# Altium footprint library mobinbyn-Header.PcbLib: 297 footprints (part 17 of 23)
Each footprint in its own frame and in the unit in brackets; x right, y up, seen from the top. Pads: shape width x height; smd on the part's side, far side on the other; paste and mask are expansions set on the pad; w line width, h text height; cw(c..) or ccw(c..) is an arc to the next point about the centre after c.
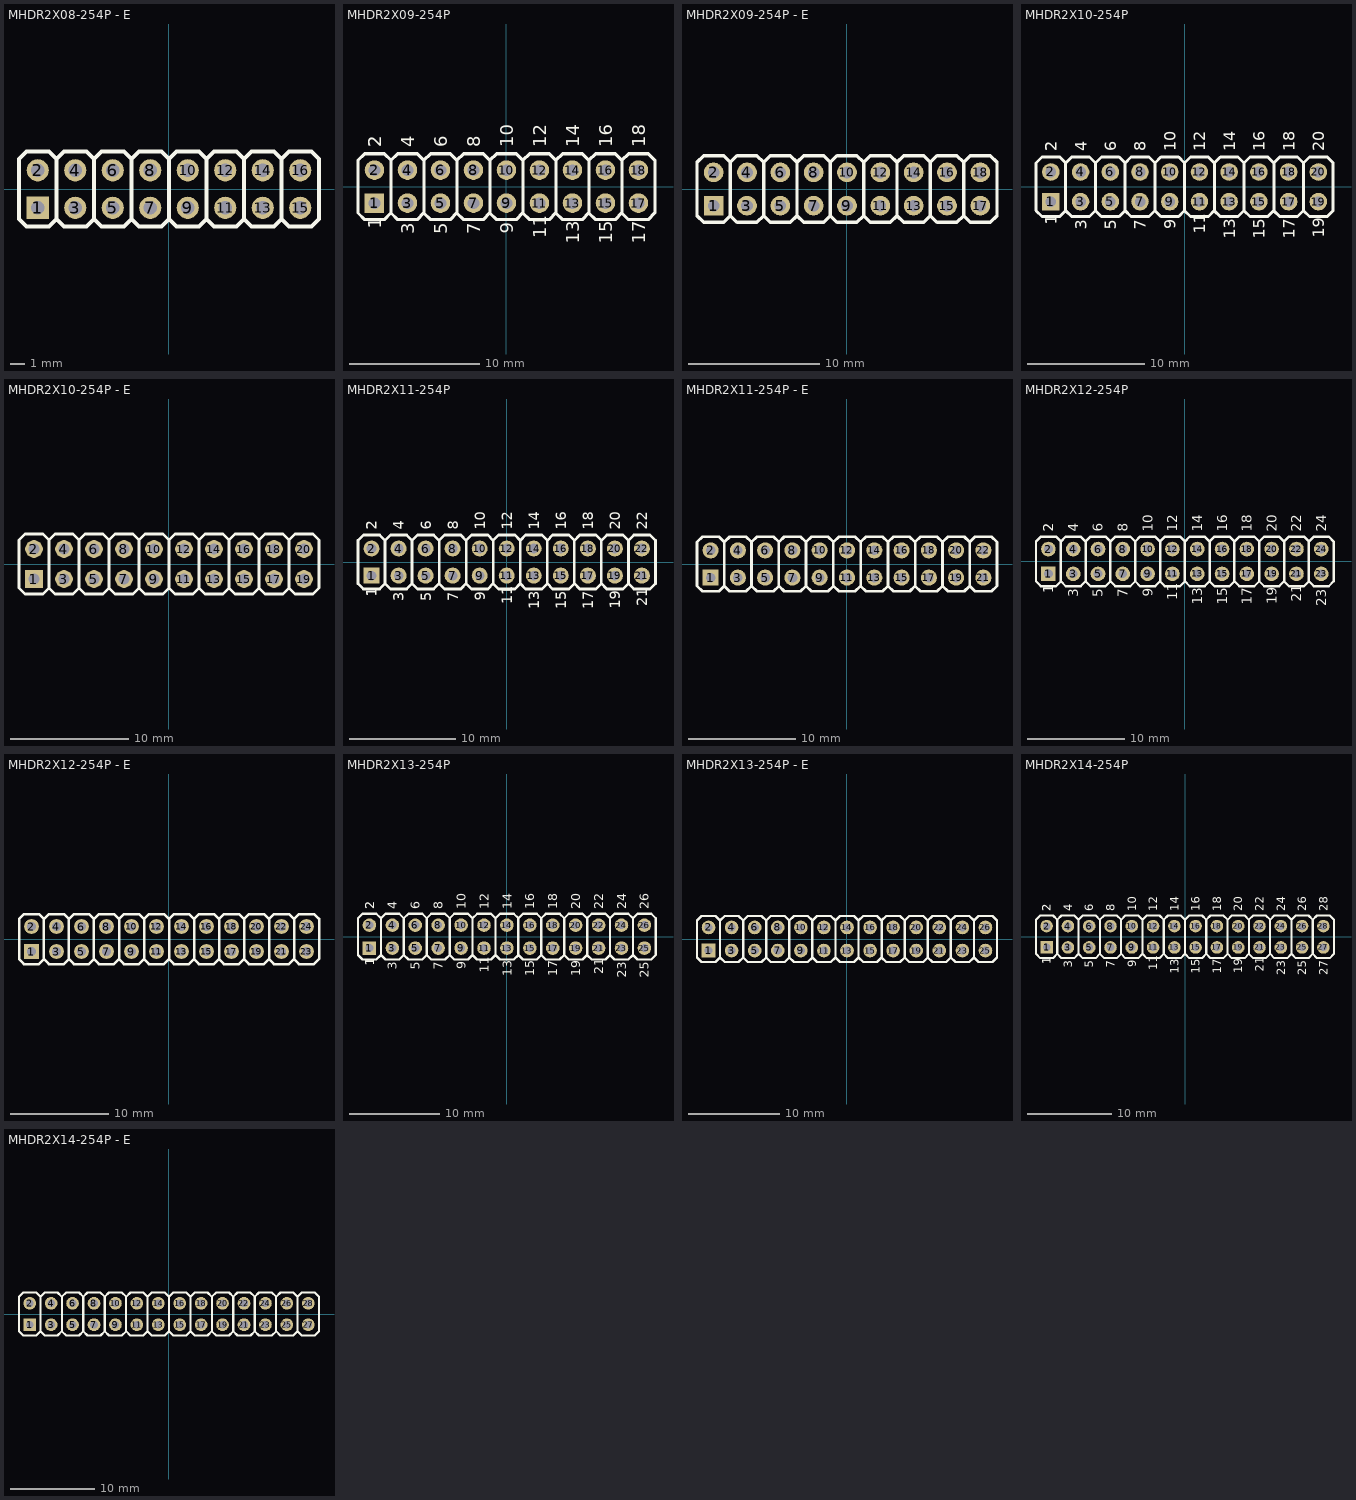
[diagram p16: the footprints below, top view; thin cyan lines are the x and y axes]

## MHDR2X08-254P - E [mm] "Male Header 2X08 with 2.54 mm Pitch"
pads (16):
  rect 1.5x1.5 hole 0.9: 1(-8.89,-1.27)
  round 1.5 hole 0.9: 2(-8.89,1.27) 3(-6.35,-1.27) 4(-6.35,1.27) 5(-3.81,-1.27) 6(-3.81,1.27) 7(-1.27,-1.27) 8(-1.27,1.27) 9(1.27,-1.27) 10(1.27,1.27) 11(3.81,-1.27) 12(3.81,1.27) 13(6.35,-1.27) 14(6.35,1.27) 15(8.89,-1.27) 16(8.89,1.27)
Top Overlay:
  lines w0.254: -7.62,-2.032 -7.113,-2.538 -5.588,-2.538 -5.08,-2.03 -5.08,2.034 -4.572,2.542 -3.049,2.542 -2.54,2.032 ; -7.62,2.032 -8.129,2.542 -9.652,2.542 -10.16,2.034 -10.16,-2.032 -9.653,-2.538 -8.128,-2.538 -7.62,-2.03 -7.62,2.034 -7.112,2.542 -5.589,2.542 -5.08,2.032 ; -5.08,-2.032 -4.573,-2.538 -3.048,-2.538 -2.54,-2.03 -2.54,2.034 -2.032,2.542 -0.509,2.542 0,2.032 ; -2.54,-2.032 -2.033,-2.538 -0.508,-2.538 0,-2.03 0,2.034 0.508,2.542 2.031,2.542 2.54,2.032 ; 0,-2.032 0.507,-2.538 2.032,-2.538 2.54,-2.03 2.54,2.034 3.048,2.542 4.571,2.542 5.08,2.032 ; 2.54,-2.032 3.047,-2.538 4.572,-2.538 5.08,-2.03 5.08,2.034 5.588,2.542 7.111,2.542 7.62,2.032 ; 5.08,-2.032 5.587,-2.538 7.112,-2.538 7.62,-2.03 7.62,2.034 8.128,2.542 9.651,2.542 10.16,2.032 ; 7.62,-2.032 8.127,-2.538 9.652,-2.538 10.16,-2.03 10.16,2.034
3D body "PIN.STEP": height 8.43, standoff -2.49, extent 7.62,-2.54 10.16,0
3D body "PIN.STEP": height 8.43, standoff -2.49, extent 7.62,0 10.16,2.54
3D body "PIN.STEP": height 8.43, standoff -2.49, extent -10.16,0 -7.62,2.54
3D body "PIN_mid.STEP": height 8.43, standoff -2.49, extent 5.08,-2.54 7.62,0
3D body "PIN_mid.STEP": height 8.43, standoff -2.49, extent 2.54,-2.54 5.08,0
3D body "PIN_mid.STEP": height 8.43, standoff -2.49, extent 0,-2.54 2.54,0
3D body "PIN_mid.STEP": height 8.43, standoff -2.49, extent -2.54,-2.54 0,0
3D body "PIN_mid.STEP": height 8.43, standoff -2.49, extent -5.08,-2.54 -2.54,0
3D body "PIN_mid.STEP": height 8.43, standoff -2.49, extent -7.62,-2.54 -5.08,0
3D body "PIN_mid.STEP": height 8.43, standoff -2.49, extent -7.62,0 -5.08,2.54
3D body "PIN_mid.STEP": height 8.43, standoff -2.49, extent 5.08,0 7.62,2.54
3D body "PIN_mid.STEP": height 8.43, standoff -2.49, extent 2.54,0 5.08,2.54
3D body "PIN_mid.STEP": height 8.43, standoff -2.49, extent 0,0 2.54,2.54
3D body "PIN_mid.STEP": height 8.43, standoff -2.49, extent -2.54,0 0,2.54
3D body "PIN_mid.STEP": height 8.43, standoff -2.49, extent -5.08,0 -2.54,2.54
3D body "PIN.STEP": height 8.43, standoff -2.49, extent -10.16,-2.54 -7.62,0

## MHDR2X09-254P [mm] "Male Header 2X09 with 2.54 mm Pitch"
pads (18):
  rect 1.5x1.5 hole 0.9: 1(-10.16,-1.27)
  round 1.5 hole 0.9: 2(-10.16,1.27) 3(-7.62,-1.27) 4(-7.62,1.27) 5(-5.08,-1.27) 6(-5.08,1.27) 7(-2.54,-1.27) 8(-2.54,1.27) 9(0,-1.27) 10(0,1.27) 11(2.54,-1.27) 12(2.54,1.27) 13(5.08,-1.27) 14(5.08,1.27) 15(7.62,-1.27) 16(7.62,1.27) 17(10.16,-1.27) 18(10.16,1.27)
Top Overlay:
  lines w0.254: -8.89,-2.032 -8.383,-2.538 -6.858,-2.538 -6.35,-2.03 -6.35,2.034 -5.842,2.542 -4.319,2.542 -3.81,2.032 ; -8.89,2.032 -9.399,2.542 -10.922,2.542 -11.43,2.034 -11.43,-2.032 -10.923,-2.538 -9.398,-2.538 -8.89,-2.03 -8.89,2.034 -8.382,2.542 -6.859,2.542 -6.35,2.032 ; -6.35,-2.032 -5.843,-2.538 -4.318,-2.538 -3.81,-2.03 -3.81,2.034 -3.302,2.542 -1.779,2.542 -1.27,2.032 ; -3.81,-2.032 -3.303,-2.538 -1.778,-2.538 -1.27,-2.03 -1.27,2.034 -0.762,2.542 0.761,2.542 1.27,2.032 ; -1.27,-2.032 -0.763,-2.538 0.762,-2.538 1.27,-2.03 1.27,2.034 1.778,2.542 3.301,2.542 3.81,2.032 ; 1.27,-2.032 1.777,-2.538 3.302,-2.538 3.81,-2.03 3.81,2.034 4.318,2.542 5.841,2.542 6.35,2.032 ; 3.81,-2.032 4.317,-2.538 5.842,-2.538 6.35,-2.03 6.35,2.034 6.858,2.542 8.381,2.542 8.89,2.032 ; 6.35,-2.032 6.857,-2.538 8.382,-2.538 8.89,-2.03 8.89,2.034 9.398,2.542 10.921,2.542 11.43,2.032 ; 8.89,-2.032 9.397,-2.538 10.922,-2.538 11.43,-2.03 11.43,2.034
  text "1" at -9.652,-3.253 h1
  text "2" at -9.652,3.048 h1
  text "2" at -9.652,3.048 h1
  text "1" at -9.652,-3.253 h1
  text "4" at -7.112,3.048 h1
  text "3" at -7.112,-3.682 h1
  text "6" at -4.572,3.048 h1
  text "5" at -4.572,-3.682 h1
  text "8" at -2.032,3.048 h1
  text "7" at -2.032,-3.682 h1
  text "10" at 0.508,3.048 h1
  text "9" at 0.508,-3.634 h1
  text "12" at 3.048,3.048 h1
  text "11" at 3.048,-3.986 h1
  text "14" at 5.588,3.048 h1
  text "13" at 5.588,-4.415 h1
  text "16" at 8.128,3.048 h1
  text "15" at 8.128,-4.415 h1
  text "18" at 10.668,3.048 h1
  text "17" at 10.668,-4.415 h1
3D body "PIN.STEP": height 8.43, standoff -2.49, extent 8.89,-2.54 11.43,0
3D body "PIN.STEP": height 8.43, standoff -2.49, extent 8.89,0 11.43,2.54
3D body "PIN.STEP": height 8.43, standoff -2.49, extent -11.43,0 -8.89,2.54
3D body "PIN_mid.STEP": height 8.43, standoff -2.49, extent 6.35,-2.54 8.89,0
3D body "PIN_mid.STEP": height 8.43, standoff -2.49, extent 3.81,-2.54 6.35,0
3D body "PIN_mid.STEP": height 8.43, standoff -2.49, extent 1.27,-2.54 3.81,0
3D body "PIN_mid.STEP": height 8.43, standoff -2.49, extent -1.27,-2.54 1.27,0
3D body "PIN_mid.STEP": height 8.43, standoff -2.49, extent -3.81,-2.54 -1.27,0
3D body "PIN_mid.STEP": height 8.43, standoff -2.49, extent -6.35,-2.54 -3.81,0
3D body "PIN_mid.STEP": height 8.43, standoff -2.49, extent -8.89,-2.54 -6.35,0
3D body "PIN_mid.STEP": height 8.43, standoff -2.49, extent -8.89,0 -6.35,2.54
3D body "PIN_mid.STEP": height 8.43, standoff -2.49, extent 6.35,0 8.89,2.54
3D body "PIN_mid.STEP": height 8.43, standoff -2.49, extent 3.81,0 6.35,2.54
3D body "PIN_mid.STEP": height 8.43, standoff -2.49, extent 1.27,0 3.81,2.54
3D body "PIN_mid.STEP": height 8.43, standoff -2.49, extent -1.27,0 1.27,2.54
3D body "PIN_mid.STEP": height 8.43, standoff -2.49, extent -3.81,0 -1.27,2.54
3D body "PIN_mid.STEP": height 8.43, standoff -2.49, extent -6.35,0 -3.81,2.54
3D body "PIN.STEP": height 8.43, standoff -2.49, extent -11.43,-2.54 -8.89,0

## MHDR2X09-254P - E [mm] "Male Header 2X09 with 2.54 mm Pitch"
pads (18):
  rect 1.5x1.5 hole 0.9: 1(-10.16,-1.27)
  round 1.5 hole 0.9: 2(-10.16,1.27) 3(-7.62,-1.27) 4(-7.62,1.27) 5(-5.08,-1.27) 6(-5.08,1.27) 7(-2.54,-1.27) 8(-2.54,1.27) 9(0,-1.27) 10(0,1.27) 11(2.54,-1.27) 12(2.54,1.27) 13(5.08,-1.27) 14(5.08,1.27) 15(7.62,-1.27) 16(7.62,1.27) 17(10.16,-1.27) 18(10.16,1.27)
Top Overlay:
  lines w0.254: -8.89,-2.032 -8.383,-2.538 -6.858,-2.538 -6.35,-2.03 -6.35,2.034 -5.842,2.542 -4.319,2.542 -3.81,2.032 ; -8.89,2.032 -9.399,2.542 -10.922,2.542 -11.43,2.034 -11.43,-2.032 -10.923,-2.538 -9.398,-2.538 -8.89,-2.03 -8.89,2.034 -8.382,2.542 -6.859,2.542 -6.35,2.032 ; -6.35,-2.032 -5.843,-2.538 -4.318,-2.538 -3.81,-2.03 -3.81,2.034 -3.302,2.542 -1.779,2.542 -1.27,2.032 ; -3.81,-2.032 -3.303,-2.538 -1.778,-2.538 -1.27,-2.03 -1.27,2.034 -0.762,2.542 0.761,2.542 1.27,2.032 ; -1.27,-2.032 -0.763,-2.538 0.762,-2.538 1.27,-2.03 1.27,2.034 1.778,2.542 3.301,2.542 3.81,2.032 ; 1.27,-2.032 1.777,-2.538 3.302,-2.538 3.81,-2.03 3.81,2.034 4.318,2.542 5.841,2.542 6.35,2.032 ; 3.81,-2.032 4.317,-2.538 5.842,-2.538 6.35,-2.03 6.35,2.034 6.858,2.542 8.381,2.542 8.89,2.032 ; 6.35,-2.032 6.857,-2.538 8.382,-2.538 8.89,-2.03 8.89,2.034 9.398,2.542 10.921,2.542 11.43,2.032 ; 8.89,-2.032 9.397,-2.538 10.922,-2.538 11.43,-2.03 11.43,2.034
3D body "PIN.STEP": height 8.43, standoff -2.49, extent -11.43,-2.54 -8.89,0
3D body "PIN_mid.STEP": height 8.43, standoff -2.49, extent -6.35,0 -3.81,2.54
3D body "PIN_mid.STEP": height 8.43, standoff -2.49, extent -3.81,0 -1.27,2.54
3D body "PIN_mid.STEP": height 8.43, standoff -2.49, extent -1.27,0 1.27,2.54
3D body "PIN_mid.STEP": height 8.43, standoff -2.49, extent 1.27,0 3.81,2.54
3D body "PIN_mid.STEP": height 8.43, standoff -2.49, extent 3.81,0 6.35,2.54
3D body "PIN_mid.STEP": height 8.43, standoff -2.49, extent 6.35,0 8.89,2.54
3D body "PIN_mid.STEP": height 8.43, standoff -2.49, extent -8.89,0 -6.35,2.54
3D body "PIN_mid.STEP": height 8.43, standoff -2.49, extent -8.89,-2.54 -6.35,0
3D body "PIN_mid.STEP": height 8.43, standoff -2.49, extent -6.35,-2.54 -3.81,0
3D body "PIN_mid.STEP": height 8.43, standoff -2.49, extent -3.81,-2.54 -1.27,0
3D body "PIN_mid.STEP": height 8.43, standoff -2.49, extent -1.27,-2.54 1.27,0
3D body "PIN_mid.STEP": height 8.43, standoff -2.49, extent 1.27,-2.54 3.81,0
3D body "PIN_mid.STEP": height 8.43, standoff -2.49, extent 3.81,-2.54 6.35,0
3D body "PIN_mid.STEP": height 8.43, standoff -2.49, extent 6.35,-2.54 8.89,0
3D body "PIN.STEP": height 8.43, standoff -2.49, extent -11.43,0 -8.89,2.54
3D body "PIN.STEP": height 8.43, standoff -2.49, extent 8.89,0 11.43,2.54
3D body "PIN.STEP": height 8.43, standoff -2.49, extent 8.89,-2.54 11.43,0

## MHDR2X10-254P [mm] "Male Header 2X10 with 2.54 mm Pitch"
pads (20):
  rect 1.5x1.5 hole 0.9: 1(-11.43,-1.27)
  round 1.5 hole 0.9: 2(-11.43,1.27) 3(-8.89,-1.27) 4(-8.89,1.27) 5(-6.35,-1.27) 6(-6.35,1.27) 7(-3.81,-1.27) 8(-3.81,1.27) 9(-1.27,-1.27) 10(-1.27,1.27) 11(1.27,-1.27) 12(1.27,1.27) 13(3.81,-1.27) 14(3.81,1.27) 15(6.35,-1.27) 16(6.35,1.27) 17(8.89,-1.27) 18(8.89,1.27) 19(11.43,-1.27) 20(11.43,1.27)
Top Overlay:
  lines w0.254: -10.16,-2.032 -9.653,-2.538 -8.128,-2.538 -7.62,-2.03 -7.62,2.034 -7.112,2.542 -5.589,2.542 -5.08,2.032 ; -10.16,2.032 -10.669,2.542 -12.192,2.542 -12.7,2.034 -12.7,-2.032 -12.193,-2.538 -10.668,-2.538 -10.16,-2.03 -10.16,2.034 -9.652,2.542 -8.129,2.542 -7.62,2.032 ; -7.62,-2.032 -7.113,-2.538 -5.588,-2.538 -5.08,-2.03 -5.08,2.034 -4.572,2.542 -3.049,2.542 -2.54,2.032 ; -5.08,-2.032 -4.573,-2.538 -3.048,-2.538 -2.54,-2.03 -2.54,2.034 -2.032,2.542 -0.509,2.542 0,2.032 ; -2.54,-2.032 -2.033,-2.538 -0.508,-2.538 0,-2.03 0,2.034 0.508,2.542 2.031,2.542 2.54,2.032 ; 0,-2.032 0.507,-2.538 2.032,-2.538 2.54,-2.03 2.54,2.034 3.048,2.542 4.571,2.542 5.08,2.032 ; 2.54,-2.032 3.047,-2.538 4.572,-2.538 5.08,-2.03 5.08,2.034 5.588,2.542 7.111,2.542 7.62,2.032 ; 5.08,-2.032 5.587,-2.538 7.112,-2.538 7.62,-2.03 7.62,2.034 8.128,2.542 9.651,2.542 10.16,2.032 ; 7.62,-2.032 8.127,-2.538 9.652,-2.538 10.16,-2.03 10.16,2.034 10.668,2.542 12.191,2.542 12.7,2.032 ; 10.16,-2.032 10.667,-2.538 12.192,-2.538 12.7,-2.03 12.7,2.034
  text "19" at 11.938,-4.367 h1
  text "20" at 11.938,3.048 h1
  text "17" at 9.398,-4.415 h1
  text "18" at 9.398,3.048 h1
  text "15" at 6.858,-4.415 h1
  text "16" at 6.858,3.048 h1
  text "13" at 4.318,-4.415 h1
  text "14" at 4.318,3.048 h1
  text "11" at 1.778,-3.986 h1
  text "12" at 1.778,3.048 h1
  text "9" at -0.762,-3.634 h1
  text "10" at -0.762,3.048 h1
  text "7" at -3.302,-3.682 h1
  text "8" at -3.302,3.048 h1
  text "5" at -5.842,-3.682 h1
  text "6" at -5.842,3.048 h1
  text "3" at -8.382,-3.682 h1
  text "4" at -8.382,3.048 h1
  text "1" at -10.922,-3.253 h1
  text "2" at -10.922,3.048 h1
  text "2" at -10.922,3.048 h1
  text "1" at -10.922,-3.253 h1
3D body "PIN.STEP": height 8.43, standoff -2.49, extent 10.16,-2.54 12.7,0
3D body "PIN.STEP": height 8.43, standoff -2.49, extent 10.16,0 12.7,2.54
3D body "PIN.STEP": height 8.43, standoff -2.49, extent -12.7,0 -10.16,2.54
3D body "PIN_mid.STEP": height 8.43, standoff -2.49, extent 7.62,-2.54 10.16,0
3D body "PIN_mid.STEP": height 8.43, standoff -2.49, extent 5.08,-2.54 7.62,0
3D body "PIN_mid.STEP": height 8.43, standoff -2.49, extent 2.54,-2.54 5.08,0
3D body "PIN_mid.STEP": height 8.43, standoff -2.49, extent 0,-2.54 2.54,0
3D body "PIN_mid.STEP": height 8.43, standoff -2.49, extent -2.54,-2.54 0,0
3D body "PIN_mid.STEP": height 8.43, standoff -2.49, extent -5.08,-2.54 -2.54,0
3D body "PIN_mid.STEP": height 8.43, standoff -2.49, extent -7.62,-2.54 -5.08,0
3D body "PIN_mid.STEP": height 8.43, standoff -2.49, extent -10.16,-2.54 -7.62,0
3D body "PIN_mid.STEP": height 8.43, standoff -2.49, extent -10.16,0 -7.62,2.54
3D body "PIN_mid.STEP": height 8.43, standoff -2.49, extent 7.62,0 10.16,2.54
3D body "PIN_mid.STEP": height 8.43, standoff -2.49, extent 5.08,0 7.62,2.54
3D body "PIN_mid.STEP": height 8.43, standoff -2.49, extent 2.54,0 5.08,2.54
3D body "PIN_mid.STEP": height 8.43, standoff -2.49, extent 0,0 2.54,2.54
3D body "PIN_mid.STEP": height 8.43, standoff -2.49, extent -2.54,0 0,2.54
3D body "PIN_mid.STEP": height 8.43, standoff -2.49, extent -5.08,0 -2.54,2.54
3D body "PIN_mid.STEP": height 8.43, standoff -2.49, extent -7.62,0 -5.08,2.54
3D body "PIN.STEP": height 8.43, standoff -2.49, extent -12.7,-2.54 -10.16,0

## MHDR2X10-254P - E [mm] "Male Header 2X10 with 2.54 mm Pitch"
pads (20):
  rect 1.5x1.5 hole 0.9: 1(-11.43,-1.27)
  round 1.5 hole 0.9: 2(-11.43,1.27) 3(-8.89,-1.27) 4(-8.89,1.27) 5(-6.35,-1.27) 6(-6.35,1.27) 7(-3.81,-1.27) 8(-3.81,1.27) 9(-1.27,-1.27) 10(-1.27,1.27) 11(1.27,-1.27) 12(1.27,1.27) 13(3.81,-1.27) 14(3.81,1.27) 15(6.35,-1.27) 16(6.35,1.27) 17(8.89,-1.27) 18(8.89,1.27) 19(11.43,-1.27) 20(11.43,1.27)
Top Overlay:
  lines w0.254: -10.16,-2.032 -9.653,-2.538 -8.128,-2.538 -7.62,-2.03 -7.62,2.034 -7.112,2.542 -5.589,2.542 -5.08,2.032 ; -10.16,2.032 -10.669,2.542 -12.192,2.542 -12.7,2.034 -12.7,-2.032 -12.193,-2.538 -10.668,-2.538 -10.16,-2.03 -10.16,2.034 -9.652,2.542 -8.129,2.542 -7.62,2.032 ; -7.62,-2.032 -7.113,-2.538 -5.588,-2.538 -5.08,-2.03 -5.08,2.034 -4.572,2.542 -3.049,2.542 -2.54,2.032 ; -5.08,-2.032 -4.573,-2.538 -3.048,-2.538 -2.54,-2.03 -2.54,2.034 -2.032,2.542 -0.509,2.542 0,2.032 ; -2.54,-2.032 -2.033,-2.538 -0.508,-2.538 0,-2.03 0,2.034 0.508,2.542 2.031,2.542 2.54,2.032 ; 0,-2.032 0.507,-2.538 2.032,-2.538 2.54,-2.03 2.54,2.034 3.048,2.542 4.571,2.542 5.08,2.032 ; 2.54,-2.032 3.047,-2.538 4.572,-2.538 5.08,-2.03 5.08,2.034 5.588,2.542 7.111,2.542 7.62,2.032 ; 5.08,-2.032 5.587,-2.538 7.112,-2.538 7.62,-2.03 7.62,2.034 8.128,2.542 9.651,2.542 10.16,2.032 ; 7.62,-2.032 8.127,-2.538 9.652,-2.538 10.16,-2.03 10.16,2.034 10.668,2.542 12.191,2.542 12.7,2.032 ; 10.16,-2.032 10.667,-2.538 12.192,-2.538 12.7,-2.03 12.7,2.034
3D body "PIN.STEP": height 8.43, standoff -2.49, extent -12.7,-2.54 -10.16,0
3D body "PIN_mid.STEP": height 8.43, standoff -2.49, extent -7.62,0 -5.08,2.54
3D body "PIN_mid.STEP": height 8.43, standoff -2.49, extent -5.08,0 -2.54,2.54
3D body "PIN_mid.STEP": height 8.43, standoff -2.49, extent -2.54,0 0,2.54
3D body "PIN_mid.STEP": height 8.43, standoff -2.49, extent 0,0 2.54,2.54
3D body "PIN_mid.STEP": height 8.43, standoff -2.49, extent 2.54,0 5.08,2.54
3D body "PIN_mid.STEP": height 8.43, standoff -2.49, extent 5.08,0 7.62,2.54
3D body "PIN_mid.STEP": height 8.43, standoff -2.49, extent 7.62,0 10.16,2.54
3D body "PIN_mid.STEP": height 8.43, standoff -2.49, extent -10.16,0 -7.62,2.54
3D body "PIN_mid.STEP": height 8.43, standoff -2.49, extent -10.16,-2.54 -7.62,0
3D body "PIN_mid.STEP": height 8.43, standoff -2.49, extent -7.62,-2.54 -5.08,0
3D body "PIN_mid.STEP": height 8.43, standoff -2.49, extent -5.08,-2.54 -2.54,0
3D body "PIN_mid.STEP": height 8.43, standoff -2.49, extent -2.54,-2.54 0,0
3D body "PIN_mid.STEP": height 8.43, standoff -2.49, extent 0,-2.54 2.54,0
3D body "PIN_mid.STEP": height 8.43, standoff -2.49, extent 2.54,-2.54 5.08,0
3D body "PIN_mid.STEP": height 8.43, standoff -2.49, extent 5.08,-2.54 7.62,0
3D body "PIN_mid.STEP": height 8.43, standoff -2.49, extent 7.62,-2.54 10.16,0
3D body "PIN.STEP": height 8.43, standoff -2.49, extent -12.7,0 -10.16,2.54
3D body "PIN.STEP": height 8.43, standoff -2.49, extent 10.16,0 12.7,2.54
3D body "PIN.STEP": height 8.43, standoff -2.49, extent 10.16,-2.54 12.7,0

## MHDR2X11-254P [mm] "Male Header 2X11 with 2.54 mm Pitch"
pads (22):
  rect 1.5x1.5 hole 0.9: 1(-12.7,-1.27)
  round 1.5 hole 0.9: 2(-12.7,1.27) 3(-10.16,-1.27) 4(-10.16,1.27) 5(-7.62,-1.27) 6(-7.62,1.27) 7(-5.08,-1.27) 8(-5.08,1.27) 9(-2.54,-1.27) 10(-2.54,1.27) 11(0,-1.27) 12(0,1.27) 13(2.54,-1.27) 14(2.54,1.27) 15(5.08,-1.27) 16(5.08,1.27) 17(7.62,-1.27) 18(7.62,1.27) 19(10.16,-1.27) 20(10.16,1.27) 21(12.7,-1.27) 22(12.7,1.27)
Top Overlay:
  lines w0.254: -11.43,-2.032 -10.923,-2.538 -9.398,-2.538 -8.89,-2.03 -8.89,2.034 -8.382,2.542 -6.859,2.542 -6.35,2.032 ; -11.43,2.032 -11.939,2.542 -13.462,2.542 -13.97,2.034 -13.97,-2.032 -13.463,-2.538 -11.938,-2.538 -11.43,-2.03 -11.43,2.034 -10.922,2.542 -9.399,2.542 -8.89,2.032 ; -8.89,-2.032 -8.383,-2.538 -6.858,-2.538 -6.35,-2.03 -6.35,2.034 -5.842,2.542 -4.319,2.542 -3.81,2.032 ; -6.35,-2.032 -5.843,-2.538 -4.318,-2.538 -3.81,-2.03 -3.81,2.034 -3.302,2.542 -1.779,2.542 -1.27,2.032 ; -3.81,-2.032 -3.303,-2.538 -1.778,-2.538 -1.27,-2.03 -1.27,2.034 -0.762,2.542 0.761,2.542 1.27,2.032 ; -1.27,-2.032 -0.763,-2.538 0.762,-2.538 1.27,-2.03 1.27,2.034 1.778,2.542 3.301,2.542 3.81,2.032 ; 1.27,-2.032 1.777,-2.538 3.302,-2.538 3.81,-2.03 3.81,2.034 4.318,2.542 5.841,2.542 6.35,2.032 ; 3.81,-2.032 4.317,-2.538 5.842,-2.538 6.35,-2.03 6.35,2.034 6.858,2.542 8.381,2.542 8.89,2.032 ; 6.35,-2.032 6.857,-2.538 8.382,-2.538 8.89,-2.03 8.89,2.034 9.398,2.542 10.921,2.542 11.43,2.032 ; 8.89,-2.032 9.397,-2.538 10.922,-2.538 11.43,-2.03 11.43,2.034 11.938,2.542 13.461,2.542 13.97,2.032 ; 11.43,-2.032 11.937,-2.538 13.462,-2.538 13.97,-2.03 13.97,2.034
  text "21" at 13.208,-4.144 h1
  text "22" at 13.208,3.048 h1
  text "19" at 10.668,-4.367 h1
  text "20" at 10.668,3.048 h1
  text "17" at 8.128,-4.415 h1
  text "18" at 8.128,3.048 h1
  text "15" at 5.588,-4.415 h1
  text "16" at 5.588,3.048 h1
  text "13" at 3.048,-4.415 h1
  text "14" at 3.048,3.048 h1
  text "11" at 0.508,-3.986 h1
  text "12" at 0.508,3.048 h1
  text "9" at -2.032,-3.634 h1
  text "10" at -2.032,3.048 h1
  text "7" at -4.572,-3.682 h1
  text "8" at -4.572,3.048 h1
  text "5" at -7.112,-3.682 h1
  text "6" at -7.112,3.048 h1
  text "3" at -9.652,-3.682 h1
  text "4" at -9.652,3.048 h1
  text "1" at -12.192,-3.253 h1
  text "2" at -12.192,3.048 h1
  text "2" at -12.192,3.048 h1
  text "1" at -12.192,-3.253 h1
3D body "PIN.STEP": height 8.43, standoff -2.49, extent -13.97,-2.54 -11.43,0
3D body "PIN_mid.STEP": height 8.43, standoff -2.49, extent -8.89,0 -6.35,2.54
3D body "PIN_mid.STEP": height 8.43, standoff -2.49, extent -6.35,0 -3.81,2.54
3D body "PIN_mid.STEP": height 8.43, standoff -2.49, extent -3.81,0 -1.27,2.54
3D body "PIN_mid.STEP": height 8.43, standoff -2.49, extent -1.27,0 1.27,2.54
3D body "PIN_mid.STEP": height 8.43, standoff -2.49, extent 1.27,0 3.81,2.54
3D body "PIN_mid.STEP": height 8.43, standoff -2.49, extent 3.81,0 6.35,2.54
3D body "PIN_mid.STEP": height 8.43, standoff -2.49, extent 6.35,0 8.89,2.54
3D body "PIN_mid.STEP": height 8.43, standoff -2.49, extent 8.89,0 11.43,2.54
3D body "PIN_mid.STEP": height 8.43, standoff -2.49, extent -11.43,0 -8.89,2.54
3D body "PIN_mid.STEP": height 8.43, standoff -2.49, extent -11.43,-2.54 -8.89,0
3D body "PIN_mid.STEP": height 8.43, standoff -2.49, extent -8.89,-2.54 -6.35,0
3D body "PIN_mid.STEP": height 8.43, standoff -2.49, extent -6.35,-2.54 -3.81,0
3D body "PIN_mid.STEP": height 8.43, standoff -2.49, extent -3.81,-2.54 -1.27,0
3D body "PIN_mid.STEP": height 8.43, standoff -2.49, extent -1.27,-2.54 1.27,0
3D body "PIN_mid.STEP": height 8.43, standoff -2.49, extent 1.27,-2.54 3.81,0
3D body "PIN_mid.STEP": height 8.43, standoff -2.49, extent 3.81,-2.54 6.35,0
3D body "PIN_mid.STEP": height 8.43, standoff -2.49, extent 6.35,-2.54 8.89,0
3D body "PIN_mid.STEP": height 8.43, standoff -2.49, extent 8.89,-2.54 11.43,0
3D body "PIN.STEP": height 8.43, standoff -2.49, extent -13.97,0 -11.43,2.54
3D body "PIN.STEP": height 8.43, standoff -2.49, extent 11.43,0 13.97,2.54
3D body "PIN.STEP": height 8.43, standoff -2.49, extent 11.43,-2.54 13.97,0

## MHDR2X11-254P - E [mm] "Male Header 2X11 with 2.54 mm Pitch"
pads (22):
  rect 1.5x1.5 hole 0.9: 1(-12.7,-1.27)
  round 1.5 hole 0.9: 2(-12.7,1.27) 3(-10.16,-1.27) 4(-10.16,1.27) 5(-7.62,-1.27) 6(-7.62,1.27) 7(-5.08,-1.27) 8(-5.08,1.27) 9(-2.54,-1.27) 10(-2.54,1.27) 11(0,-1.27) 12(0,1.27) 13(2.54,-1.27) 14(2.54,1.27) 15(5.08,-1.27) 16(5.08,1.27) 17(7.62,-1.27) 18(7.62,1.27) 19(10.16,-1.27) 20(10.16,1.27) 21(12.7,-1.27) 22(12.7,1.27)
Top Overlay:
  lines w0.254: -11.43,-2.032 -10.923,-2.538 -9.398,-2.538 -8.89,-2.03 -8.89,2.034 -8.382,2.542 -6.859,2.542 -6.35,2.032 ; -11.43,2.032 -11.939,2.542 -13.462,2.542 -13.97,2.034 -13.97,-2.032 -13.463,-2.538 -11.938,-2.538 -11.43,-2.03 -11.43,2.034 -10.922,2.542 -9.399,2.542 -8.89,2.032 ; -8.89,-2.032 -8.383,-2.538 -6.858,-2.538 -6.35,-2.03 -6.35,2.034 -5.842,2.542 -4.319,2.542 -3.81,2.032 ; -6.35,-2.032 -5.843,-2.538 -4.318,-2.538 -3.81,-2.03 -3.81,2.034 -3.302,2.542 -1.779,2.542 -1.27,2.032 ; -3.81,-2.032 -3.303,-2.538 -1.778,-2.538 -1.27,-2.03 -1.27,2.034 -0.762,2.542 0.761,2.542 1.27,2.032 ; -1.27,-2.032 -0.763,-2.538 0.762,-2.538 1.27,-2.03 1.27,2.034 1.778,2.542 3.301,2.542 3.81,2.032 ; 1.27,-2.032 1.777,-2.538 3.302,-2.538 3.81,-2.03 3.81,2.034 4.318,2.542 5.841,2.542 6.35,2.032 ; 3.81,-2.032 4.317,-2.538 5.842,-2.538 6.35,-2.03 6.35,2.034 6.858,2.542 8.381,2.542 8.89,2.032 ; 6.35,-2.032 6.857,-2.538 8.382,-2.538 8.89,-2.03 8.89,2.034 9.398,2.542 10.921,2.542 11.43,2.032 ; 8.89,-2.032 9.397,-2.538 10.922,-2.538 11.43,-2.03 11.43,2.034 11.938,2.542 13.461,2.542 13.97,2.032 ; 11.43,-2.032 11.937,-2.538 13.462,-2.538 13.97,-2.03 13.97,2.034
3D body "PIN.STEP": height 8.43, standoff -2.49, extent 11.43,-2.54 13.97,0
3D body "PIN.STEP": height 8.43, standoff -2.49, extent 11.43,0 13.97,2.54
3D body "PIN.STEP": height 8.43, standoff -2.49, extent -13.97,0 -11.43,2.54
3D body "PIN_mid.STEP": height 8.43, standoff -2.49, extent 8.89,-2.54 11.43,0
3D body "PIN_mid.STEP": height 8.43, standoff -2.49, extent 6.35,-2.54 8.89,0
3D body "PIN_mid.STEP": height 8.43, standoff -2.49, extent 3.81,-2.54 6.35,0
3D body "PIN_mid.STEP": height 8.43, standoff -2.49, extent 1.27,-2.54 3.81,0
3D body "PIN_mid.STEP": height 8.43, standoff -2.49, extent -1.27,-2.54 1.27,0
3D body "PIN_mid.STEP": height 8.43, standoff -2.49, extent -3.81,-2.54 -1.27,0
3D body "PIN_mid.STEP": height 8.43, standoff -2.49, extent -6.35,-2.54 -3.81,0
3D body "PIN_mid.STEP": height 8.43, standoff -2.49, extent -8.89,-2.54 -6.35,0
3D body "PIN_mid.STEP": height 8.43, standoff -2.49, extent -11.43,-2.54 -8.89,0
3D body "PIN_mid.STEP": height 8.43, standoff -2.49, extent -11.43,0 -8.89,2.54
3D body "PIN_mid.STEP": height 8.43, standoff -2.49, extent 8.89,0 11.43,2.54
3D body "PIN_mid.STEP": height 8.43, standoff -2.49, extent 6.35,0 8.89,2.54
3D body "PIN_mid.STEP": height 8.43, standoff -2.49, extent 3.81,0 6.35,2.54